# Altium footprint library TelemetryFTP.PcbLib: 98 footprints (part 1 of 7)
Each footprint in its own frame and in the unit in brackets; x right, y up, seen from the top. Pads: shape width x height; smd on the part's side, far side on the other; paste and mask are expansions set on the pad; w line width, h text height; cw(c..) or ccw(c..) is an arc to the next point about the centre after c.
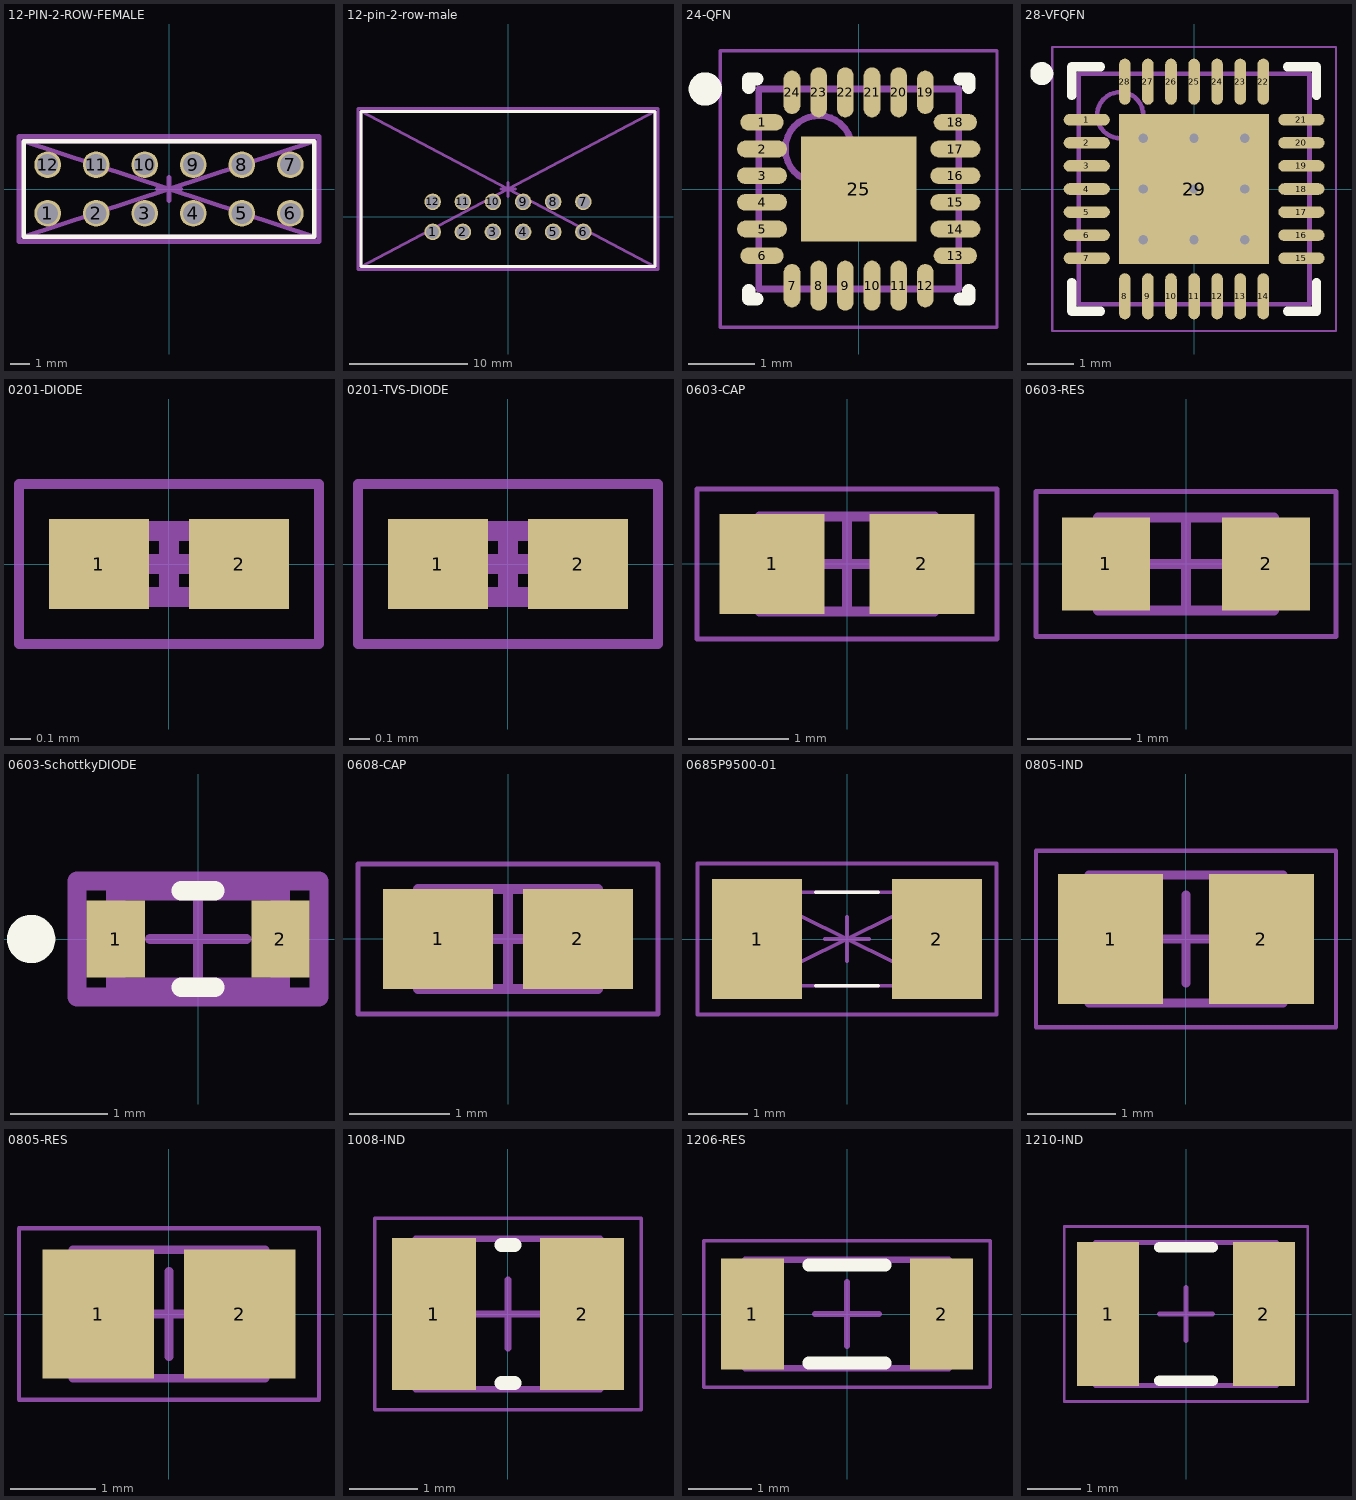
[diagram p0: the footprints below, top view; thin cyan lines are the x and y axes]

## 12-PIN-2-ROW-FEMALE [mm]
pads (12):
  round 1.4 hole 1.1 mask+0.05: 1(-6.35,-1.27) 2(-3.81,-1.27) 3(-1.27,-1.27) 4(1.27,-1.27) 5(3.81,-1.27) 6(6.35,-1.27) 7(6.35,1.27) 8(3.81,1.27) 9(1.27,1.27) 10(-1.27,1.27) 11(-3.81,1.27) 12(-6.35,1.27)
Top Overlay:
  lines w0.256: -7.6,-2.5 -7.6,2.5 7.6,2.5 7.6,-2.5 -7.6,-2.5
Mechanical 1:
  lines w0.256: -7.6,-2.5 7.6,2.5 ; -7.6,-2.5 -7.6,2.5 ; -7.6,-2.5 7.6,-2.5 ; -7.6,2.5 7.6,-2.5 ; -7.6,2.5 7.6,2.5 ; 7.6,-2.5 7.6,2.5
Top Courtyard:
  lines w0.256: -7.85,-2.75 7.85,-2.75 7.85,2.75 -7.85,2.75 -7.85,-2.75
Top Component Center:
  lines w0.256: -0.6,0 0.6,0 ; 0,-0.6 0,0.6
3D body "215307-6.stp": height 7, standoff -3, extent -7.62,-2.53 7.62,2.53

## 12-pin-2-row-male [mm]
pads (12):
  round 1.4 hole 1.1 mask+0.05: 1(-6.35,-1.27) 2(-3.81,-1.27) 3(-1.27,-1.27) 4(1.27,-1.27) 5(3.81,-1.27) 6(6.35,-1.27) 7(6.35,1.27) 8(3.81,1.27) 9(1.27,1.27) 10(-1.27,1.27) 11(-3.81,1.27) 12(-6.35,1.27)
Top Overlay:
  lines w0.256: -12.4,-4.2 -12.4,8.9 12.4,8.9 12.4,-4.2 -12.4,-4.2
Mechanical 1:
  lines w0.256: -12.4,-4.2 -12.4,8.9 ; -12.4,-4.2 12.4,-4.2 ; -12.4,-4.2 12.4,8.9 ; -12.4,8.9 12.4,8.9 ; -12.4,8.9 12.4,-4.2 ; 12.4,-4.2 12.4,8.9
Top Courtyard:
  lines w0.256: -12.65,-4.45 -12.65,9.15 12.65,9.15 12.65,-4.45 -12.65,-4.45
Top Component Center:
  lines w0.256: -0.585,2.336 0.615,2.336 ; 0,1.7 0,2.9
3D body "5-102567-1.stp": height 14, standoff -4.16, extent -12.446,-4.267 12.446,8.941

## 24-QFN [mm]
height 0.9
pads (25):
  oval 0.65x0.25 smd mask+0.04: 1(-1.45,1) 6(-1.45,-1) 13(1.45,-1) 18(1.45,1)
  oval 0.75x0.25 smd mask+0.05: 2(-1.45,0.6) 3(-1.45,0.2) 4(-1.45,-0.2) 5(-1.45,-0.6) 14(1.45,-0.6) 15(1.45,-0.2) 16(1.45,0.2) 17(1.45,0.6)
  oval 0.25x0.65 smd mask+0.04: 7(-1,-1.45) 12(1,-1.45) 19(1,1.45) 24(-1,1.45)
  oval 0.25x0.75 smd mask+0.05: 8(-0.6,-1.45) 9(-0.2,-1.45) 10(0.2,-1.45) 11(0.6,-1.45) 20(0.6,1.45) 21(0.2,1.45) 22(-0.2,1.45) 23(-0.6,1.45)
  rect 1.73x1.57 smd mask+0.05: 25(0,0)
Top Overlay:
  circle w0.25: c-2.3,1.5 r0.125
  lines w0.2: -1.65,-1.525 -1.65,-1.65 -1.525,-1.65 ; -1.65,1.525 -1.65,1.65 -1.525,1.65 ; 1.525,-1.65 1.65,-1.65 1.65,-1.525 ; 1.525,1.65 1.65,1.65 1.65,1.525
Top Courtyard:
  lines w0.05: -2.075,-2.075 -2.075,2.075 2.075,2.075 2.075,-2.075 -2.075,-2.075
  lines w0.1: -0.5,0 0.5,0 ; 0,-0.5 0,0.5
Top Assembly:
  circle w0.1: c-0.6,0.6 r0.5
  lines w0.1: -1.5,-1.5 -1.5,1.5 1.5,1.5 1.5,-1.5 -1.5,-1.5
3D body: height 0.9, standoff 0, extent -1.5,-1.5 1.5,1.5

## 28-VFQFN [mm] "QFN, 28-Leads, Body 5.00x5.00mm, Pitch 0.50mm, Thermal Pad 3.25x3.25mm, IPC Medium Density"
height 1
pads (29):
  oval 1x0.25 smd mask+0.05: 1(-2.325,1.5) 2(-2.325,1) 3(-2.325,0.5) 4(-2.325,0) 5(-2.325,-0.5) 6(-2.325,-1) 7(-2.325,-1.5) 15(2.325,-1.5) 16(2.325,-1) 17(2.325,-0.5) 18(2.325,0) 19(2.325,0.5) 20(2.325,1) 21(2.325,1.5)
  oval 0.25x1 smd mask+0.05: 8(-1.5,-2.325) 9(-1,-2.325) 10(-0.5,-2.325) 11(0,-2.325) 12(0.5,-2.325) 13(1,-2.325) 14(1.5,-2.325) 22(1.5,2.325) 23(1,2.325) 24(0.5,2.325) 25(0,2.325) 26(-0.5,2.325) 27(-1,2.325) 28(-1.5,2.325)
  rect 3.25x3.25 smd mask+0.05: 29(0,0)
via -1.1,1.1 diameter 0.5 hole 0.2
via 0,1.1 diameter 0.5 hole 0.2
via 1.1,1.1 diameter 0.5 hole 0.2
via -1.1,0 diameter 0.5 hole 0.2
via 0,0 diameter 0.5 hole 0.2
via 1.1,0 diameter 0.5 hole 0.2
via -1.1,-1.1 diameter 0.5 hole 0.2
via 0,-1.1 diameter 0.5 hole 0.2
via 1.1,-1.1 diameter 0.5 hole 0.2
Top Overlay:
  circle w0.25: c-3.3,2.5 r0.125
  lines w0.2: -2.65,-2.025 -2.65,-2.65 -2.025,-2.65 ; -2.65,2.025 -2.65,2.65 -2.025,2.65 ; 2.025,-2.65 2.65,-2.65 2.65,-2.025 ; 2.025,2.65 2.65,2.65 2.65,2.025
Top Courtyard:
  lines w0.05: -3.075,-3.075 -3.075,3.075 3.075,3.075 3.075,-3.075 -3.075,-3.075
  lines w0.1: -0.5,0 0.5,0 ; 0,-0.5 0,0.5
Top Assembly:
  circle w0.1: c-1.6,1.6 r0.5
  lines w0.1: -2.5,-2.5 -2.5,2.5 2.5,2.5 2.5,-2.5 -2.5,-2.5
3D body: height 1, standoff 0.05, extent -2.5,-2.5 2.5,2.5

## 0201-DIODE [mm]
height 0.32
pads (2):
  rect 0.5x0.45 smd mask+0.05: 1(-0.35,0) 2(0.35,0)
Top Courtyard:
  lines w0.05: -0.75,-0.4 0.75,-0.4 0.75,0.4 -0.75,0.4 -0.75,-0.4
  lines w0.1: -0.165,0 0.165,0 ; 0,-0.165 0,0.165
Top Assembly:
  lines w0.1: -0.315,-0.165 0.315,-0.165 0.315,0.165 -0.315,0.165 -0.315,-0.165
3D body: height 0.32, standoff 0, extent 0.175,-0.165 0.315,0.165
3D body: height 0.32, standoff 0, extent -0.315,-0.165 -0.175,0.165
3D body: height 0.32, standoff 0, extent -0.175,-0.165 0.175,0.165

## 0201-TVS-DIODE [mm]
height 0.32
pads (2):
  rect 0.5x0.45 smd mask+0.05: 1(-0.35,0) 2(0.35,0)
Top Courtyard:
  lines w0.05: -0.75,-0.4 -0.75,0.4 0.75,0.4 0.75,-0.4 -0.75,-0.4
  lines w0.1: -0.165,0 0.165,0 ; 0,-0.165 0,0.165
Top Assembly:
  lines w0.1: -0.315,-0.165 -0.315,0.165 0.315,0.165 0.315,-0.165 -0.315,-0.165
3D body: height 0.32, standoff 0, extent -0.175,-0.165 0.175,0.165
3D body: height 0.32, standoff 0, extent -0.315,-0.165 -0.175,0.165
3D body: height 0.32, standoff 0, extent 0.175,-0.165 0.315,0.165

## 0603-CAP [mm]
height 0.95
pads (2):
  rect 1.05x1 smd: 1(-0.75,0) 2(0.75,0)
Mechanical 13:
  lines w0.1: -0.875,-0.475 0.875,-0.475 0.875,0.475 -0.875,0.475 -0.875,-0.475
Mechanical 15:
  lines w0.05: -1.5,-0.75 1.5,-0.75 1.5,0.75 -1.5,0.75 -1.5,-0.75
  lines w0.1: -0.475,0 0.475,0 ; 0,-0.475 0,0.475
3D body: height 0.95, standoff 0, extent 0.525,-0.475 0.875,0.475
3D body: height 0.95, standoff 0, extent -0.875,-0.475 -0.525,0.475
3D body: height 0.95, standoff 0, extent -0.525,-0.475 0.525,0.475

## 0603-RES [mm]
height 0.55
pads (2):
  rect 0.85x0.9 smd: 1(-0.775,0) 2(0.775,0)
Mechanical 13:
  lines w0.1: -0.85,-0.45 -0.85,0.45 0.85,0.45 0.85,-0.45 -0.85,-0.45
Mechanical 15:
  lines w0.05: -1.45,-0.7 -1.45,0.7 1.45,0.7 1.45,-0.7 -1.45,-0.7
  lines w0.1: -0.45,0 0.45,0 ; 0,-0.45 0,0.45
3D body: height 0.55, standoff 0, extent -0.6,-0.45 0.6,0.45
3D body: height 0.55, standoff 0, extent -0.85,-0.45 -0.6,0.45
3D body: height 0.55, standoff 0, extent 0.6,-0.45 0.85,0.45

## 0603-SchottkyDIODE [mm]
pads (2):
  rect 0.6x0.8 smd paste+0 mask+0: 1(-0.85,0) 2(0.85,0)
Top Overlay:
  circle w0.25: c-1.725,0 r0.125
  lines w0.2: -0.175,-0.5 0.175,-0.5 ; -0.175,0.5 0.175,0.5
Top 3D Body:
  lines w0.2: -0.85,-0.5 0.85,-0.5 0.85,0.5 -0.85,0.5 -0.85,-0.5
Top Courtyard:
  lines w0.2: -1.25,-0.6 1.25,-0.6 1.25,0.6 -1.25,0.6 -1.25,-0.6
Top Assembly:
  lines w0.2: -1.25,-0.6 1.25,-0.6 1.25,0.6 -1.25,0.6 -1.25,-0.6
  text ".Designator" at 0,0 h1
Top Component Center:
  lines w0.1: -0.5,0 0.5,0 ; 0,-0.5 0,0.5
3D body "Diode_AVX_SD0603S040S0R2_eec.STEP": height 0.25, standoff 0, extent -1.25,-0.6 1.25,0.6

## 0608-CAP [mm]
height 1
pads (2):
  rect 1.1x1 smd: 1(-0.7,0) 2(0.7,0)
Mechanical 13:
  lines w0.1: -0.9,-0.5 -0.9,0.5 0.9,0.5 0.9,-0.5 -0.9,-0.5
Mechanical 15:
  lines w0.05: -1.5,-0.75 -1.5,0.75 1.5,0.75 1.5,-0.75 -1.5,-0.75
  lines w0.1: -0.5,0 0.5,0 ; 0,-0.5 0,0.5
3D body: height 1, standoff 0, extent -0.52,-0.5 0.52,0.5
3D body: height 1, standoff 0, extent -0.9,-0.5 -0.52,0.5
3D body: height 1, standoff 0, extent 0.52,-0.5 0.9,0.5

## 0685P9500-01 [mm]
pads (2):
  rect 1.52x2.03 smd mask+0.05: 1(-1.52,0) 2(1.52,0)
Top Overlay:
  lines w0.064: -0.525,-0.79 0.525,-0.79 ; -0.525,0.79 0.525,0.79
Mechanical 1:
  lines w0.064: -1.6,-0.79 1.6,0.79 ; -1.6,-0.79 -1.6,0.79 ; -1.6,-0.79 1.6,-0.79 ; -1.6,0.79 1.6,-0.79 ; -1.6,0.79 1.6,0.79 ; 1.6,-0.79 1.6,0.79
Top Courtyard:
  lines w0.064: -2.525,-1.275 -2.525,1.275 2.525,1.275 2.525,-1.275 -2.525,-1.275
Top Component Center:
  lines w0.064: -0.375,0 0.375,0 ; 0,-0.375 0,0.375
3D body "FUSE_0685P9500-01_BEL.step": height 0.94, standoff 0.1, extent -1.702,-0.889 1.702,0.889

## 0805-IND [mm]
height 1.05
pads (2):
  rect 1.19x1.47 smd: 1(-0.855,0) 2(0.855,0)
Top Courtyard:
  lines w0.05: -1.7,-1 1.7,-1 1.7,1 -1.7,1 -1.7,-1
  lines w0.1: -0.5,0 0.5,0 ; 0,-0.5 0,0.5
Top Assembly:
  lines w0.1: -1.1,-0.725 1.1,-0.725 1.1,0.725 -1.1,0.725 -1.1,-0.725
3D body: height 1.05, standoff 0, extent 0.6,-0.725 1.1,0.725
3D body: height 1.05, standoff 0, extent -1.1,-0.725 -0.6,0.725
3D body: height 1.05, standoff 0, extent -0.6,-0.725 0.6,0.725

## 0805-RES [mm]
height 0.6
pads (2):
  rect 1.3x1.5 smd: 1(-0.825,0) 2(0.825,0)
Top Courtyard:
  lines w0.05: -1.75,-1 1.75,-1 1.75,1 -1.75,1 -1.75,-1
  lines w0.1: -0.5,0 0.5,0 ; 0,-0.5 0,0.5
Top Assembly:
  lines w0.1: -1.125,-0.75 1.125,-0.75 1.125,0.75 -1.125,0.75 -1.125,-0.75
3D body: height 0.6, standoff 0, extent 0.625,-0.75 1.125,0.75
3D body: height 0.6, standoff 0, extent -1.125,-0.75 -0.625,0.75
3D body: height 0.6, standoff 0, extent -0.625,-0.75 0.625,0.75

## 1008-IND [mm]
height 1
pads (2):
  rect 1.23x2.22 smd: 1(-1.085,0) 2(1.085,0)
Top Overlay:
  lines w0.2: -0.1,-1.01 0.1,-1.01 ; -0.1,1.01 0.1,1.01
Top Courtyard:
  lines w0.05: -1.95,-1.4 1.95,-1.4 1.95,1.4 -1.95,1.4 -1.95,-1.4
  lines w0.1: -0.5,0 0.5,0 ; 0,-0.5 0,0.5
Top Assembly:
  lines w0.1: -1.35,-1.1 1.35,-1.1 1.35,1.1 -1.35,1.1 -1.35,-1.1
3D body: height 1, standoff 0, extent 0.75,-1.1 1.35,1.1
3D body: height 1, standoff 0, extent -1.35,-1.1 -0.75,1.1
3D body: height 1, standoff 0, extent -0.75,-1.1 0.75,1.1

## 1206-RES [mm]
height 0.65
pads (2):
  rect 0.99x1.74 smd: 1(-1.485,0) 2(1.485,0)
Top Overlay:
  lines w0.2: -0.6,-0.77 0.6,-0.77 ; -0.6,0.77 0.6,0.77
Top Courtyard:
  lines w0.05: -2.25,-1.15 -2.25,1.15 2.25,1.15 2.25,-1.15 -2.25,-1.15
  lines w0.1: -0.5,0 0.5,0 ; 0,-0.5 0,0.5
Top Assembly:
  lines w0.1: -1.6,-0.85 -1.6,0.85 1.6,0.85 1.6,-0.85 -1.6,-0.85
3D body: height 0.65, standoff 0, extent -1.2,-0.85 1.2,0.85
3D body: height 0.65, standoff 0, extent -1.6,-0.85 -1.2,0.85
3D body: height 0.65, standoff 0, extent 1.2,-0.85 1.6,0.85

## 1210-IND [mm]
height 2.5
pads (2):
  rect 1.17x2.72 smd: 1(-1.47,0) 2(1.47,0)
Top Overlay:
  lines w0.2: -0.5,-1.26 0.5,-1.26 ; -0.5,1.26 0.5,1.26
Mechanical 13:
  lines w0.1: -1.7,-1.35 -1.7,1.35 1.7,1.35 1.7,-1.35 -1.7,-1.35
Mechanical 15:
  lines w0.05: -2.3,-1.65 -2.3,1.65 2.3,1.65 2.3,-1.65 -2.3,-1.65
  lines w0.1: -0.5,0 0.5,0 ; 0,-0.5 0,0.5
3D body: height 2.5, standoff 0, extent -1.7,-1.35 -1.12,1.35
3D body: height 2.5, standoff 0, extent 1.12,-1.35 1.7,1.35
3D body: height 2.5, standoff 0, extent -1.12,-1.35 1.12,1.35